# Altium footprint library Pcb.PcbLib: 33 footprints (part 2 of 3)
Each footprint in its own frame and in the unit in brackets; x right, y up, seen from the top. Pads: shape width x height; smd on the part's side, far side on the other; paste and mask are expansions set on the pad; w line width, h text height; cw(c..) or ccw(c..) is an arc to the next point about the centre after c.
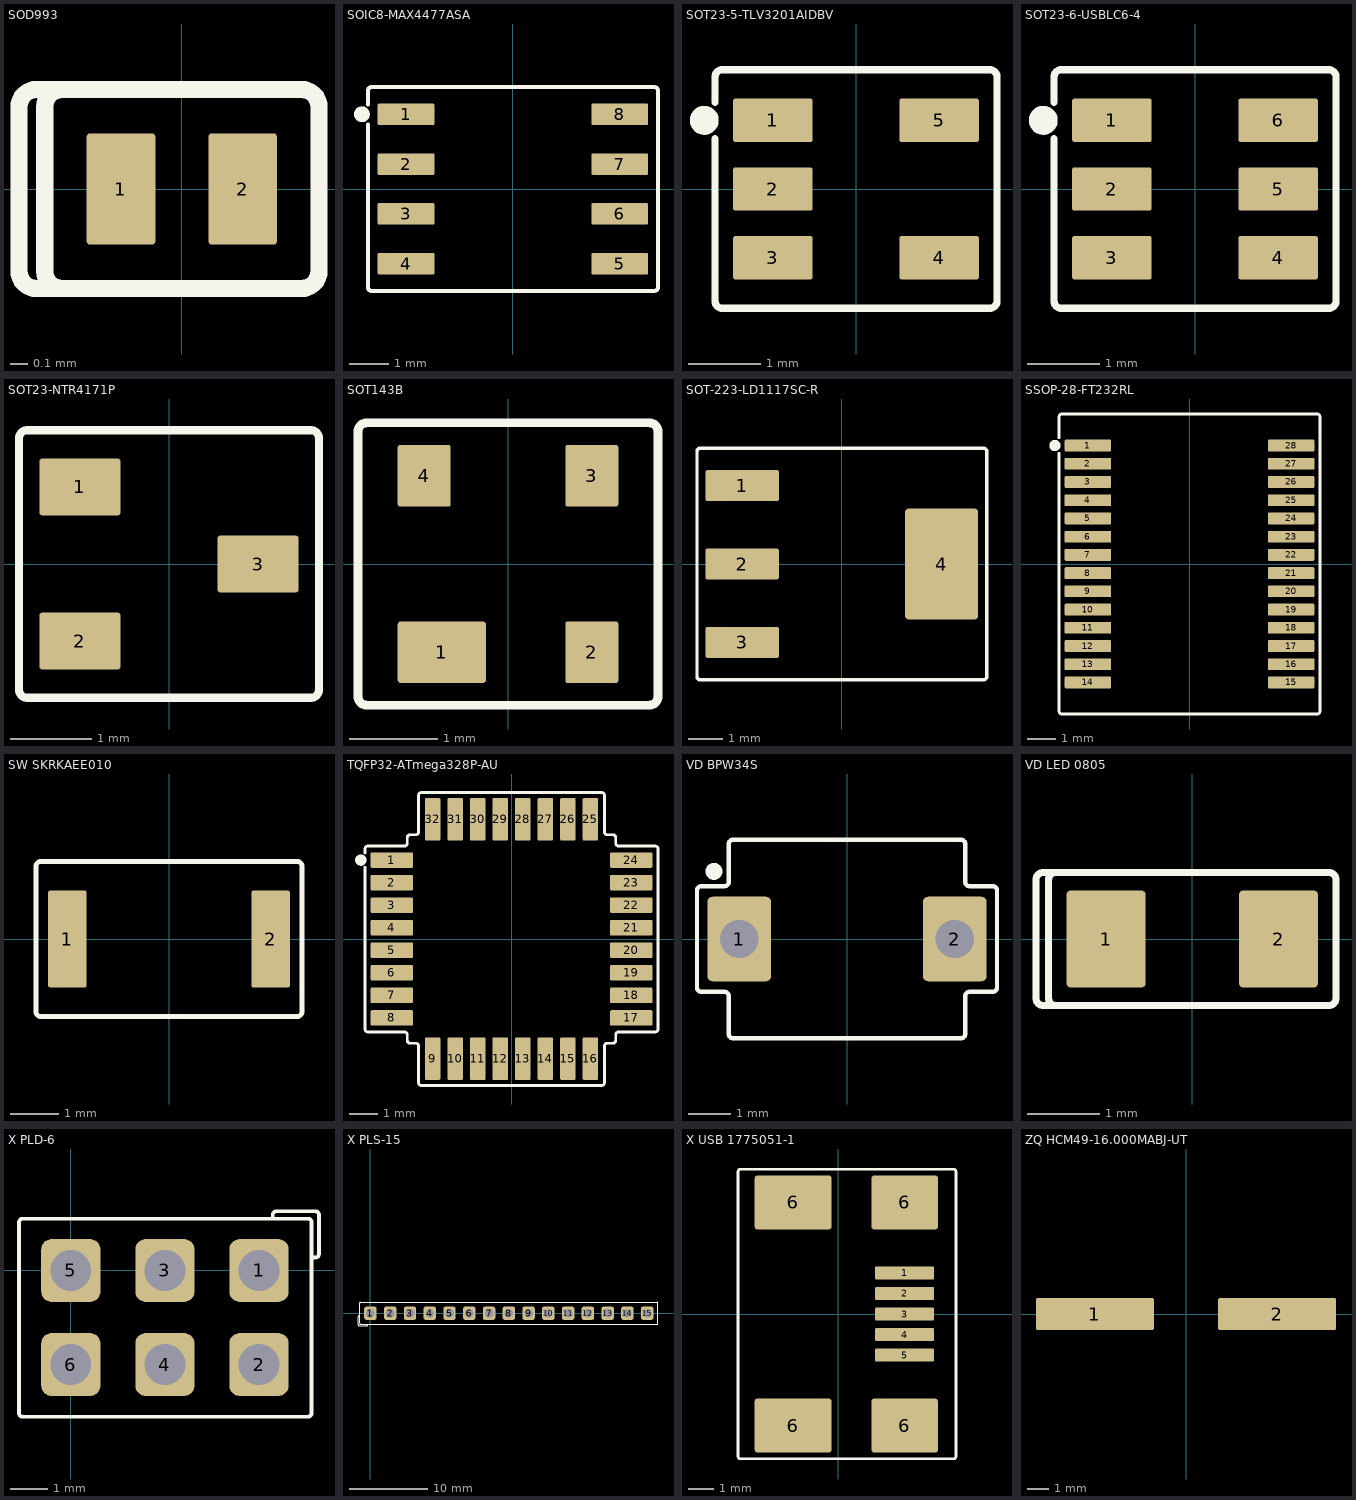
[diagram p1: the footprints below, top view; thin cyan lines are the x and y axes]

## SOD993 [mm] "Diode, IPC Low Density"
height 0.3
pads (2):
  rrect10% 0.4x0.65 smd: 1(-0.355,0) 2(0.355,0)
Top Overlay:
  lines w0.1: -0.7,-0.58 cw(c-0.7,-0.48) -0.8,-0.48 -0.8,0.48 cw(c-0.7,0.48) -0.7,0.58 ; -0.95,-0.48 ccw(c-0.85,-0.48) -0.85,-0.58 0.7,-0.58 ccw(c0.7,-0.48) 0.8,-0.48 0.8,0.48 ccw(c0.7,0.48) 0.7,0.58 -0.85,0.58 ccw(c-0.85,0.48) -0.95,0.48 -0.95,-0.48
3D body "SOD993.SLDPRT": height 0.28, standoff -0.03, extent -0.5,-0.3 0.5,0.3

## SOIC8-MAX4477ASA [mm] "IPC Medium Density"
height 1.75
pads (8):
  rrect15% 1.45x0.55 smd: 1(-2.725,1.905) 2(-2.725,0.635) 3(-2.725,-0.635) 4(-2.725,-1.905) 5(2.725,-1.905) 6(2.725,-0.635) 7(2.725,0.635) 8(2.725,1.905)
Top Overlay:
  circle w0.2: c-3.85,1.905 r0.1
  lines w0.1: -3.7,1.65 -3.7,-2.5 ccw(c-3.6,-2.5) -3.6,-2.6 3.6,-2.6 ccw(c3.6,-2.5) 3.7,-2.5 3.7,2.5 ccw(c3.6,2.5) 3.6,2.6 -3.6,2.6 ccw(c-3.6,2.5) -3.7,2.5 -3.7,2.15
3D body "SOIC08-MAX4477ASA.STEP": height 1.99, standoff -0.02, extent -3.082,-2.5 3.081,2.5

## SOT23-5-TLV3201AIDBV [mm] "IPC Medium Density"
height 1.45
pads (5):
  rrect10% 1.1x0.6 smd: 1(-1.15,0.95) 2(-1.15,0) 3(-1.15,-0.95) 4(1.15,-0.95) 5(1.15,0.95)
Top Overlay:
  circle w0.2: c-2.1,0.95 r0.1
  lines w0.1: -1.95,0.7 -1.95,-1.55 ; -1.95,1.2 -1.95,1.55 ; -1.95,-1.55 ccw(c-1.95,-1.55) -1.95,-1.55 ; -1.95,-1.55 ccw(c-1.85,-1.55) -1.85,-1.65 1.85,-1.65 ccw(c1.85,-1.55) 1.95,-1.55 1.95,1.55 ccw(c1.85,1.55) 1.85,1.65 -1.85,1.65 ccw(c-1.85,1.55) -1.95,1.55 ; -1.95,1.55 ccw(c-1.95,1.55) -1.95,1.55
3D body "SOT23-5-TLV3201AIDBV.STEP": height 1.18, standoff -0.01, extent -1.418,-1.5 1.418,1.5

## SOT23-6-USBLC6-4 [mm] "IPC Medium Density"
height 1.45
pads (6):
  rrect10% 1.1x0.6 smd: 1(-1.15,0.95) 2(-1.15,0) 3(-1.15,-0.95) 4(1.15,-0.95) 5(1.15,0) 6(1.15,0.95)
Top Overlay:
  circle w0.2: c-2.1,0.95 r0.1
  lines w0.1: -1.95,0.7 -1.95,-1.55 ; -1.95,1.2 -1.95,1.55 ; -1.95,-1.55 ccw(c-1.85,-1.55) -1.85,-1.65 1.85,-1.65 ccw(c1.85,-1.55) 1.95,-1.55 1.95,1.55 ccw(c1.85,1.55) 1.85,1.65 -1.85,1.65 ccw(c-1.85,1.55) -1.95,1.55 ; -1.95,-1.55 ccw(c-1.95,-1.55) -1.95,-1.55 ; -1.95,1.55 ccw(c-1.95,1.55) -1.95,1.55
3D body "SOT23-6-USBLC6-4SC6.STEP": height 1.18, standoff -0.01, extent -1.418,-1.5 1.418,1.5

## SOT23-NTR4171P [mm] "IPC Medium Density"
height 1.11
pads (3):
  rrect10% 1x0.7 smd: 1(-1.1,0.95) 2(-1.1,-0.95) 3(1.1,0)
Top Overlay:
  lines w0.1: -1.85,-1.55 ccw(c-1.75,-1.55) -1.75,-1.65 1.75,-1.65 ccw(c1.75,-1.55) 1.85,-1.55 1.85,1.55 ccw(c1.75,1.55) 1.75,1.65 -1.75,1.65 ccw(c-1.75,1.55) -1.85,1.55 -1.85,-1.55
3D body "SOT223-NTR4171P.STEP": height 1.11, standoff 0, extent -1.33,-1.5 1.27,1.5

## SOT143B [mm]
pads (4):
  rrect10% 1x0.7 smd: 1(-0.75,-1)
  rrect10% 0.6x0.7 smd: 2(0.95,-1) 3(0.95,1) 4(-0.95,1)
Top Overlay:
  lines w0.1: -1.7,-1.5 ccw(c-1.6,-1.5) -1.6,-1.6 1.6,-1.6 ccw(c1.6,-1.5) 1.7,-1.5 1.7,1.5 ccw(c1.6,1.5) 1.6,1.6 -1.6,1.6 ccw(c-1.6,1.5) -1.7,1.5 -1.7,-1.5
3D body "sot143.STEP": height 1.15, standoff -0.01, extent -1.5,-1.25 1.5,1.25

## SOT-223-LD1117SC-R [mm] "SOT223, IPC Medium Density"
height 1.8
pads (4):
  rrect10% 2.15x0.9 smd: 1(-2.925,2.3) 2(-2.925,0) 3(-2.925,-2.3)
  rrect10% 2.15x3.25 smd: 4(2.925,0)
Top Overlay:
  lines w0.1: -4.25,-3.3 ccw(c-4.15,-3.3) -4.15,-3.4 4.15,-3.4 ccw(c4.15,-3.3) 4.25,-3.3 4.25,3.3 ccw(c4.15,3.3) 4.15,3.4 -4.15,3.4 ccw(c-4.15,3.3) -4.25,3.3 -4.25,-3.3
3D body "SOT-223-LD1117SC-R.STEP": height 1.7, standoff -0.01, extent -3.45,-3.25 3.441,3.25

## SSOP-28-FT232RL [mm] "IPC Medium Density"
height 2
pads (28):
  rrect15% 1.65x0.42 smd mask+0.05: 1(-3.625,4.225) 2(-3.625,3.575) 3(-3.625,2.925) 4(-3.625,2.275) 5(-3.625,1.625) 6(-3.625,0.975) 7(-3.625,0.325) 8(-3.625,-0.325) 9(-3.625,-0.975) 10(-3.625,-1.625) 11(-3.625,-2.275) 12(-3.625,-2.925) 13(-3.625,-3.575) 14(-3.625,-4.225) 15(3.625,-4.225) 16(3.625,-3.575) 17(3.625,-2.925) 18(3.625,-2.275) 19(3.625,-1.625) 20(3.625,-0.975) 21(3.625,-0.325) 22(3.625,0.325) 23(3.625,0.975) 24(3.625,1.625) 25(3.625,2.275) 26(3.625,2.925) 27(3.625,3.575) 28(3.625,4.225)
Top Overlay:
  circle w0.2: c-4.8,4.225 r0.1
  lines w0.1: -4.65,3.95 -4.65,-5.25 ccw(c-4.55,-5.25) -4.55,-5.35 4.55,-5.35 ccw(c4.55,-5.25) 4.65,-5.25 4.65,5.25 ccw(c4.55,5.25) 4.55,5.35 -4.55,5.35 ccw(c-4.55,5.25) -4.65,5.25 -4.65,4.5
3D body "SSOP-28-FT232RL.STEP": height 2.14, standoff -0.02, extent -3.878,-5.165 3.878,5.165

## SW SKRKAEE010 [mm]
height 2
pads (2):
  rrect10% 0.8x2 smd: 1(-2.1,0) 2(2.1,0)
Top Overlay:
  lines w0.1: -2.75,-1.5 ccw(c-2.65,-1.5) -2.65,-1.6 2.65,-1.6 ccw(c2.65,-1.5) 2.75,-1.5 2.75,1.5 ccw(c2.65,1.5) 2.65,1.6 -2.65,1.6 ccw(c-2.65,1.5) -2.75,1.5 -2.75,-1.5
3D body "SKRKAE.SLDPRT": height 1.93, standoff -0.07, extent -2.4,-1.45 2.4,1.45

## TQFP32-ATmega328P-AU [mm] "IPC Medium Density"
height 1.2
pads (32):
  rrect15% 1.5x0.55 smd mask+0.05: 1(-4.25,2.8) 2(-4.25,2) 3(-4.25,1.2) 4(-4.25,0.4) 5(-4.25,-0.4) 6(-4.25,-1.2) 7(-4.25,-2) 8(-4.25,-2.8) 17(4.25,-2.8) 18(4.25,-2) 19(4.25,-1.2) 20(4.25,-0.4) 21(4.25,0.4) 22(4.25,1.2) 23(4.25,2) 24(4.25,2.8)
  rrect15% 0.55x1.5 smd mask+0.05: 9(-2.8,-4.25) 10(-2,-4.25) 11(-1.2,-4.25) 12(-0.4,-4.25) 13(0.4,-4.25) 14(1.2,-4.25) 15(2,-4.25) 16(2.8,-4.25) 25(2.8,4.25) 26(2,4.25) 27(1.2,4.25) 28(0.4,4.25) 29(-0.4,4.25) 30(-1.2,4.25) 31(-2,4.25) 32(-2.8,4.25)
Top Overlay:
  circle w0.2: c-5.35,2.8 r0.1
  lines w0.1: -5.2,2.55 -5.2,-3.2 ccw(c-5.1,-3.2) -5.1,-3.3 -3.8,-3.3 cw(c-3.8,-3.4) -3.7,-3.4 -3.7,-3.6 ccw(c-3.6,-3.6) -3.6,-3.7 -3.4,-3.7 cw(c-3.4,-3.8) -3.3,-3.8 -3.3,-5.1 ccw(c-3.2,-5.1) -3.2,-5.2 3.2,-5.2 ccw(c3.2,-5.1) 3.3,-5.1 3.3,-3.8 cw(c3.4,-3.8) 3.4,-3.7 3.6,-3.7 ccw(c3.6,-3.6) 3.7,-3.6 3.7,-3.4 cw(c3.8,-3.4) 3.8,-3.3 5.1,-3.3 ccw(c5.1,-3.2) 5.2,-3.2 5.2,3.2 ccw(c5.1,3.2) 5.1,3.3 3.8,3.3 cw(c3.8,3.4) 3.7,3.4 3.7,3.6 ccw(c3.6,3.6) 3.6,3.7 3.4,3.7 cw(c3.4,3.8) 3.3,3.8 3.3,5.1 ccw(c3.2,5.1) 3.2,5.2 -3.2,5.2 ccw(c-3.2,5.1) -3.3,5.1 -3.3,3.8 cw(c-3.4,3.8) -3.4,3.7 -3.6,3.7 ccw(c-3.6,3.6) -3.7,3.6 -3.7,3.4 cw(c-3.8,3.4) -3.8,3.3 -5.1,3.3 ccw(c-5.1,3.2) -5.2,3.2 -5.2,3.05
3D body "TQFP-32-ATmega328P-AU.STEP": height 1.21, standoff 0, extent -4.5,-4.5 4.5,4.5

## VD BPW34S [mm]
height 2
pads (2):
  rrect15% 1.5x2 hole 0.9: 1(-2.55,0) 2(2.55,0)
Top Overlay:
  circle w0.2: c-3.15,1.6 r0.1
  lines w0.1: -3.55,-1.15 ccw(c-3.45,-1.15) -3.45,-1.25 -2.9,-1.25 cw(c-2.9,-1.35) -2.8,-1.35 -2.8,-2.25 ccw(c-2.7,-2.25) -2.7,-2.35 2.7,-2.35 ccw(c2.7,-2.25) 2.8,-2.25 2.8,-1.35 cw(c2.9,-1.35) 2.9,-1.25 3.45,-1.25 ccw(c3.45,-1.15) 3.55,-1.15 3.55,1.15 ccw(c3.45,1.15) 3.45,1.25 2.9,1.25 cw(c2.9,1.35) 2.8,1.35 2.8,2.25 ccw(c2.7,2.25) 2.7,2.35 -2.7,2.35 ccw(c-2.7,2.25) -2.8,2.25 -2.8,1.35 cw(c-2.9,1.35) -2.9,1.25 -3.45,1.25 ccw(c-3.45,1.15) -3.55,1.15 -3.55,-1.15
3D body "bpw34.STEP": height 1.73, standoff -3.47, extent -2.765,-2.203 2.635,2.197

## VD LED 0805 [mm] "IPC Medium Density"
height 0.9
pads (2):
  rrect10% 1.1x1.35 smd: 1(-1.2,0) 2(1.2,0)
Top Overlay:
  lines w0.1: -1.9,-0.925 cw(c-1.9,-0.825) -2,-0.825 -2,0.825 cw(c-1.9,0.825) -1.9,0.925 ; -2.175,-0.825 ccw(c-2.075,-0.825) -2.075,-0.925 1.9,-0.925 ccw(c1.9,-0.825) 2,-0.825 2,0.825 ccw(c1.9,0.825) 1.9,0.925 -2.075,0.925 ccw(c-2.075,0.825) -2.175,0.825 -2.175,-0.825
3D body "VD-LED-0805-Green-LTST-C171GKT-Base.SLDPRT": height 0.4, standoff 0, extent -1,-0.625 1,0.625
3D body "VD-LED-0805-Green-LTST-C171GKT-Cap.SLDPRT": height 0.9, standoff 0, extent -0.8,-0.625 0.8,0.625

## X PLD-6 [mm]
height 8.13
pads (6):
  rrect35% 1.6x1.7 hole 1.1: 1(5.08,0) 2(5.08,-2.54) 3(2.54,0) 4(2.54,-2.54) 5(0,0) 6(0,-2.54)
Top Overlay:
  lines w0.1: 5.45,1.4 5.45,1.5 cw(c5.55,1.5) 5.55,1.6 6.6,1.6 cw(c6.6,1.5) 6.7,1.5 6.7,0.45 cw(c6.6,0.45) 6.6,0.35 6.5,0.35 ; -1.4,-3.85 ccw(c-1.3,-3.85) -1.3,-3.95 6.4,-3.95 ccw(c6.4,-3.85) 6.5,-3.85 6.5,1.3 ccw(c6.4,1.3) 6.4,1.4 -1.3,1.4 ccw(c-1.3,1.3) -1.4,1.3 -1.4,-3.85
3D body "PLD-6.STEP": height 8.8, standoff -3, extent -1.27,-3.81 6.35,1.27

## X PLS-15 [mm]
height 8.13
pads (15):
  rrect35% 1.6x1.7 hole 1.1: 1(0,0) 2(2.54,0) 3(5.08,0) 4(7.62,0) 5(10.16,0) 6(12.7,0) 7(15.24,0) 8(17.78,0) 9(20.32,0) 10(22.86,0) 11(25.4,0) 12(27.94,0) 13(30.48,0) 14(33.02,0) 15(35.56,0)
Top Overlay:
  lines w0.1: -1.4,-0.35 -1.5,-0.35 ccw(c-1.5,-0.45) -1.6,-0.45 -1.6,-1.5 ccw(c-1.5,-1.5) -1.5,-1.6 -0.45,-1.6 ccw(c-0.45,-1.5) -0.35,-1.5 -0.35,-1.4 ; -1.4,-1.3 ccw(c-1.3,-1.3) -1.3,-1.4 36.85,-1.4 ccw(c36.85,-1.3) 36.95,-1.3 36.95,1.3 ccw(c36.85,1.3) 36.85,1.4 36.65,1.4 -1.3,1.4 ccw(c-1.3,1.3) -1.4,1.3 -1.4,-1.3
3D body "PLS-15.STEP": height 8.8, standoff -3, extent -1.27,-1.27 36.83,1.27

## X USB 1775051-1 [mm]
pads (9):
  rrect15% 2.3x0.5 smd: 1(2.6,1.6) 2(2.6,0.8) 3(2.6,0) 4(2.6,-0.8) 5(2.6,-1.6)
  rrect10% 3x2.1 smd: 6(-1.75,-4.35) 6(-1.75,4.35)
  rrect10% 2.6x2.1 smd: 6(2.6,-4.35) 6(2.6,4.35)
Top Overlay:
  lines w0.1: -3.9,-5.55 ccw(c-3.8,-5.55) -3.8,-5.65 4.5,-5.65 ccw(c4.5,-5.55) 4.6,-5.55 4.6,5.55 ccw(c4.5,5.55) 4.5,5.65 -3.8,5.65 ccw(c-3.8,5.55) -3.9,5.55 -3.9,-5.55
3D body "1775051-1.SLDPRT": height 4.1, standoff 0, extent -5.65,-4.95 3.35,4.95

## ZQ HCM49-16.000MABJ-UT [mm]
height 3.6
pads (2):
  rrect10% 5.5x1.5 smd: 1(-4.25,0) 2(4.25,0)
3D body "HCM49-16.STEP": height 4.71, standoff 0, extent -6.2,-2.425 6.2,2.425